# Altium footprint library con-molex.PCBLIB: 369 footprints (part 16 of 26)
Each footprint in its own frame and in the unit in brackets; x right, y up, seen from the top. Pads: shape width x height; smd on the part's side, far side on the other; paste and mask are expansions set on the pad; w line width, h text height; cw(c..) or ccw(c..) is an arc to the next point about the centre after c.
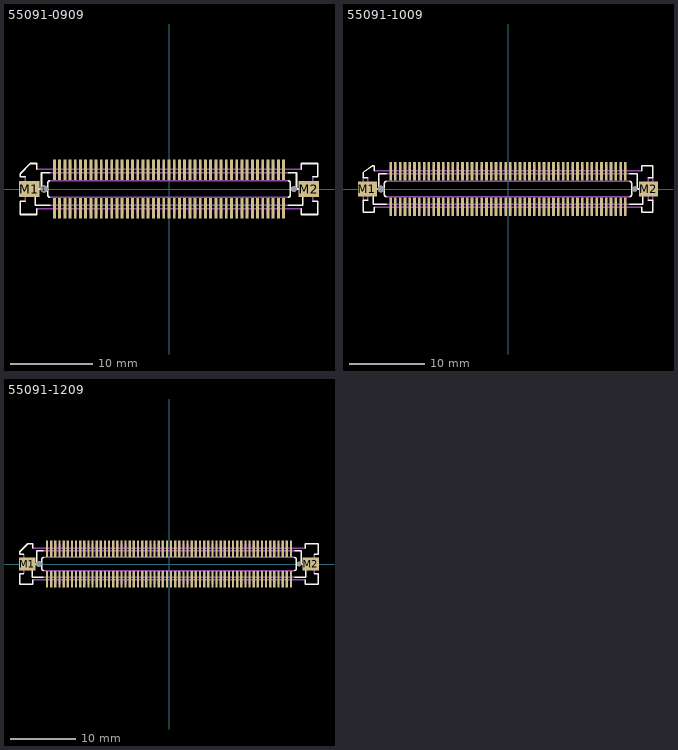
[diagram p15: the footprints below, top view; thin cyan lines are the x and y axes]

## 55091-0909 [mm]
pads (94):
  round 0.9 hole 0.9: 1(-15.225,0)
  rect 0.35x2.5 smd: 1(-13.97,2.35) 2(-13.97,-2.35) 3(-13.335,2.35) 4(-13.335,-2.35) 5(-12.7,2.35) 6(-12.7,-2.35) 7(-12.065,2.35) 8(-12.065,-2.35) 9(-11.43,2.35) 10(-11.43,-2.35) 11(-10.795,2.35) 12(-10.795,-2.35) 13(-10.16,2.35) 14(-10.16,-2.35) 15(-9.525,2.35) 16(-9.525,-2.35) 17(-8.89,2.35) 18(-8.89,-2.35) 19(-8.255,2.35) 20(-8.255,-2.35) 21(-7.62,2.35) 22(-7.62,-2.35) 23(-6.985,2.35) 24(-6.985,-2.35) 25(-6.35,2.35) 26(-6.35,-2.35) 27(-5.715,2.35) 28(-5.715,-2.35) 29(-5.08,2.35) 30(-5.08,-2.35) 31(-4.445,2.35) 32(-4.445,-2.35) 33(-3.81,2.35) 34(-3.81,-2.35) 35(-3.175,2.35) 36(-3.175,-2.35) 37(-2.54,2.35) 38(-2.54,-2.35) 39(-1.905,2.35) 40(-1.905,-2.35) 41(-1.27,2.35) 42(-1.27,-2.35) 43(-0.635,2.35) 44(-0.635,-2.35) 45(0,2.35) 46(0,-2.35) 47(0.635,2.35) 48(0.635,-2.35) 49(1.27,2.35) 50(1.27,-2.35) 51(1.905,2.35) 52(1.905,-2.35) 53(2.54,2.35) 54(2.54,-2.35) 55(3.175,2.35) 56(3.175,-2.35) 57(3.81,2.35) 58(3.81,-2.35) 59(4.445,2.35) 60(4.445,-2.35) 61(5.08,2.35) 62(5.08,-2.35) 63(5.715,2.35) 64(5.715,-2.35) 65(6.35,2.35) 66(6.35,-2.35) 67(6.985,2.35) 68(6.985,-2.35) 69(7.62,2.35) 70(7.62,-2.35) 71(8.255,2.35) 72(8.255,-2.35) 73(8.89,2.35) 74(8.89,-2.35) 75(9.525,2.35) 76(9.525,-2.35) 77(10.16,2.35) 78(10.16,-2.35) 79(10.795,2.35) 80(10.795,-2.35) 81(11.43,2.35) 82(11.43,-2.35) 83(12.065,2.35) 84(12.065,-2.35) 85(12.7,2.35) 86(12.7,-2.35) 87(13.335,2.35) 88(13.335,-2.35) 89(13.97,2.35) 90(13.97,-2.35)
  round 0.7 hole 0.7: 1(15.225,0)
  rect 2.5x2 smd: M1(-17.038,0) M2(17.038,0)
Top Overlay:
  lines w0.203: -17.537,-1.5 -18.137,-1.5 -18.137,-3.1 -16.137,-3.1 -16.137,-2.4 ; -17.537,1.5 -18.137,1.5 -18.137,1.875 -16.913,3.1 -16.137,3.1 -16.137,2.4 ; -14.537,-2 -16.287,-2 -16.287,0 -15.537,0 -15.537,2 -14.537,2 ; -14.537,-1 cw(c-14.538,-0.75) -14.788,-0.75 -14.788,0.75 cw(c-14.538,0.75) -14.537,1 ; 14.537,-2 16.287,-2 16.287,0 15.537,0 15.537,2 14.537,2 ; 14.537,-1 ccw(c14.538,-0.75) 14.788,-0.75 14.788,0.75 ccw(c14.538,0.75) 14.537,1 ; 16.137,-2.4 16.137,-3.1 18.137,-3.1 18.137,-1.5 17.537,-1.5 ; 16.137,2.4 16.137,3.1 18.137,3.1 18.137,1.5 17.537,1.5
Top Solder:
  rectangle: -14.17,1.075 -13.77,3.625
  region: -13.77,-1.075 -14.17,-1.075 -14.17,-3.625 -13.77,-3.625
  rectangle: -13.535,1.075 -13.135,3.625
  region: -13.135,-1.075 -13.535,-1.075 -13.535,-3.625 -13.135,-3.625
  rectangle: -12.9,1.075 -12.5,3.625
  region: -12.5,-1.075 -12.9,-1.075 -12.9,-3.625 -12.5,-3.625
  rectangle: -12.265,1.075 -11.865,3.625
  region: -11.865,-1.075 -12.265,-1.075 -12.265,-3.625 -11.865,-3.625
  rectangle: -11.63,1.075 -11.23,3.625
  region: -11.23,-1.075 -11.63,-1.075 -11.63,-3.625 -11.23,-3.625
  rectangle: -10.995,1.075 -10.595,3.625
  region: -10.595,-1.075 -10.995,-1.075 -10.995,-3.625 -10.595,-3.625
  rectangle: -10.36,1.075 -9.96,3.625
  region: -9.96,-1.075 -10.36,-1.075 -10.36,-3.625 -9.96,-3.625
  rectangle: -9.725,1.075 -9.325,3.625
  region: -9.325,-1.075 -9.725,-1.075 -9.725,-3.625 -9.325,-3.625
  rectangle: -9.09,1.075 -8.69,3.625
  region: -8.69,-1.075 -9.09,-1.075 -9.09,-3.625 -8.69,-3.625
  rectangle: -8.455,1.075 -8.055,3.625
  region: -8.055,-1.075 -8.455,-1.075 -8.455,-3.625 -8.055,-3.625
  rectangle: -7.82,1.075 -7.42,3.625
  region: -7.42,-1.075 -7.82,-1.075 -7.82,-3.625 -7.42,-3.625
  rectangle: -7.185,1.075 -6.785,3.625
  region: -6.785,-1.075 -7.185,-1.075 -7.185,-3.625 -6.785,-3.625
  rectangle: -6.55,1.075 -6.15,3.625
  region: -6.15,-1.075 -6.55,-1.075 -6.55,-3.625 -6.15,-3.625
  rectangle: -5.915,1.075 -5.515,3.625
  region: -5.515,-1.075 -5.915,-1.075 -5.915,-3.625 -5.515,-3.625
  rectangle: -5.28,1.075 -4.88,3.625
  region: -4.88,-1.075 -5.28,-1.075 -5.28,-3.625 -4.88,-3.625
  rectangle: -4.645,1.075 -4.245,3.625
  region: -4.245,-1.075 -4.645,-1.075 -4.645,-3.625 -4.245,-3.625
  rectangle: -4.01,1.075 -3.61,3.625
  region: -3.61,-1.075 -4.01,-1.075 -4.01,-3.625 -3.61,-3.625
  rectangle: -3.375,1.075 -2.975,3.625
  region: -2.975,-1.075 -3.375,-1.075 -3.375,-3.625 -2.975,-3.625
  rectangle: -2.74,1.075 -2.34,3.625
  region: -2.34,-1.075 -2.74,-1.075 -2.74,-3.625 -2.34,-3.625
  rectangle: -2.105,1.075 -1.705,3.625
  region: -1.705,-1.075 -2.105,-1.075 -2.105,-3.625 -1.705,-3.625
  rectangle: -1.47,1.075 -1.07,3.625
  region: -1.07,-1.075 -1.47,-1.075 -1.47,-3.625 -1.07,-3.625
  rectangle: -0.835,1.075 -0.435,3.625
  region: -0.435,-1.075 -0.835,-1.075 -0.835,-3.625 -0.435,-3.625
  rectangle: -0.2,1.075 0.2,3.625
  region: 0.2,-1.075 -0.2,-1.075 -0.2,-3.625 0.2,-3.625
  rectangle: 0.435,1.075 0.835,3.625
  region: 0.835,-1.075 0.435,-1.075 0.435,-3.625 0.835,-3.625
  rectangle: 1.07,1.075 1.47,3.625
  region: 1.47,-1.075 1.07,-1.075 1.07,-3.625 1.47,-3.625
  rectangle: 1.705,1.075 2.105,3.625
  region: 2.105,-1.075 1.705,-1.075 1.705,-3.625 2.105,-3.625
  rectangle: 2.34,1.075 2.74,3.625
  region: 2.74,-1.075 2.34,-1.075 2.34,-3.625 2.74,-3.625
  rectangle: 2.975,1.075 3.375,3.625
  region: 3.375,-1.075 2.975,-1.075 2.975,-3.625 3.375,-3.625
  rectangle: 3.61,1.075 4.01,3.625
  region: 4.01,-1.075 3.61,-1.075 3.61,-3.625 4.01,-3.625
  rectangle: 4.245,1.075 4.645,3.625
  region: 4.645,-1.075 4.245,-1.075 4.245,-3.625 4.645,-3.625
  rectangle: 4.88,1.075 5.28,3.625
  region: 5.28,-1.075 4.88,-1.075 4.88,-3.625 5.28,-3.625
  rectangle: 5.515,1.075 5.915,3.625
  region: 5.915,-1.075 5.515,-1.075 5.515,-3.625 5.915,-3.625
  rectangle: 6.15,1.075 6.55,3.625
  region: 6.55,-1.075 6.15,-1.075 6.15,-3.625 6.55,-3.625
  rectangle: 6.785,1.075 7.185,3.625
  region: 7.185,-1.075 6.785,-1.075 6.785,-3.625 7.185,-3.625
  rectangle: 7.42,1.075 7.82,3.625
  region: 7.82,-1.075 7.42,-1.075 7.42,-3.625 7.82,-3.625
  rectangle: 8.055,1.075 8.455,3.625
  region: 8.455,-1.075 8.055,-1.075 8.055,-3.625 8.455,-3.625
  rectangle: 8.69,1.075 9.09,3.625
  region: 9.09,-1.075 8.69,-1.075 8.69,-3.625 9.09,-3.625
  rectangle: 9.325,1.075 9.725,3.625
  region: 9.725,-1.075 9.325,-1.075 9.325,-3.625 9.725,-3.625
  rectangle: 9.96,1.075 10.36,3.625
  region: 10.36,-1.075 9.96,-1.075 9.96,-3.625 10.36,-3.625
  rectangle: 10.595,1.075 10.995,3.625
  region: 10.995,-1.075 10.595,-1.075 10.595,-3.625 10.995,-3.625
  rectangle: 11.23,1.075 11.63,3.625
  region: 11.63,-1.075 11.23,-1.075 11.23,-3.625 11.63,-3.625
  rectangle: 11.865,1.075 12.265,3.625
  region: 12.265,-1.075 11.865,-1.075 11.865,-3.625 12.265,-3.625
  rectangle: 12.5,1.075 12.9,3.625
  region: 12.9,-1.075 12.5,-1.075 12.5,-3.625 12.9,-3.625
  rectangle: 13.135,1.075 13.535,3.625
  region: 13.535,-1.075 13.135,-1.075 13.135,-3.625 13.535,-3.625
  rectangle: 13.77,1.075 14.17,3.625
  region: 14.17,-1.075 13.77,-1.075 13.77,-3.625 14.17,-3.625
Mechanical 16:
  rectangle: -14.12,-3.1 -13.82,-2.375
  region: -13.82,3.1 -14.12,3.1 -14.12,2.375 -13.82,2.375
  rectangle: -13.485,-3.1 -13.185,-2.375
  region: -13.185,3.1 -13.485,3.1 -13.485,2.375 -13.185,2.375
  rectangle: -12.85,-3.1 -12.55,-2.375
  region: -12.55,3.1 -12.85,3.1 -12.85,2.375 -12.55,2.375
  rectangle: -12.215,-3.1 -11.915,-2.375
  region: -11.915,3.1 -12.215,3.1 -12.215,2.375 -11.915,2.375
  rectangle: -11.58,-3.1 -11.28,-2.375
  region: -11.28,3.1 -11.58,3.1 -11.58,2.375 -11.28,2.375
  rectangle: -10.945,-3.1 -10.645,-2.375
  region: -10.645,3.1 -10.945,3.1 -10.945,2.375 -10.645,2.375
  rectangle: -10.31,-3.1 -10.01,-2.375
  region: -10.01,3.1 -10.31,3.1 -10.31,2.375 -10.01,2.375
  rectangle: -9.675,-3.1 -9.375,-2.375
  region: -9.375,3.1 -9.675,3.1 -9.675,2.375 -9.375,2.375
  rectangle: -9.04,-3.1 -8.74,-2.375
  region: -8.74,3.1 -9.04,3.1 -9.04,2.375 -8.74,2.375
  rectangle: -8.405,-3.1 -8.105,-2.375
  region: -8.105,3.1 -8.405,3.1 -8.405,2.375 -8.105,2.375
  rectangle: -7.77,-3.1 -7.47,-2.375
  region: -7.47,3.1 -7.77,3.1 -7.77,2.375 -7.47,2.375
  rectangle: -7.135,-3.1 -6.835,-2.375
  region: -6.835,3.1 -7.135,3.1 -7.135,2.375 -6.835,2.375
  rectangle: -6.5,-3.1 -6.2,-2.375
  region: -6.2,3.1 -6.5,3.1 -6.5,2.375 -6.2,2.375
  rectangle: -5.865,-3.1 -5.565,-2.375
  region: -5.565,3.1 -5.865,3.1 -5.865,2.375 -5.565,2.375
  rectangle: -5.23,-3.1 -4.93,-2.375
  region: -4.93,3.1 -5.23,3.1 -5.23,2.375 -4.93,2.375
  rectangle: -4.595,-3.1 -4.295,-2.375
  region: -4.295,3.1 -4.595,3.1 -4.595,2.375 -4.295,2.375
  rectangle: -3.96,-3.1 -3.66,-2.375
  region: -3.66,3.1 -3.96,3.1 -3.96,2.375 -3.66,2.375
  rectangle: -3.325,-3.1 -3.025,-2.375
  region: -3.025,3.1 -3.325,3.1 -3.325,2.375 -3.025,2.375
  rectangle: -2.69,-3.1 -2.39,-2.375
  region: -2.39,3.1 -2.69,3.1 -2.69,2.375 -2.39,2.375
  rectangle: -2.055,-3.1 -1.755,-2.375
  region: -1.755,3.1 -2.055,3.1 -2.055,2.375 -1.755,2.375
  rectangle: -1.42,-3.1 -1.12,-2.375
  region: -1.12,3.1 -1.42,3.1 -1.42,2.375 -1.12,2.375
  rectangle: -0.785,-3.1 -0.485,-2.375
  region: -0.485,3.1 -0.785,3.1 -0.785,2.375 -0.485,2.375
  rectangle: -0.15,-3.1 0.15,-2.375
  region: 0.15,3.1 -0.15,3.1 -0.15,2.375 0.15,2.375
  rectangle: 0.485,-3.1 0.785,-2.375
  region: 0.785,3.1 0.485,3.1 0.485,2.375 0.785,2.375
  rectangle: 1.12,-3.1 1.42,-2.375
  region: 1.42,3.1 1.12,3.1 1.12,2.375 1.42,2.375
  rectangle: 1.755,-3.1 2.055,-2.375
  region: 2.055,3.1 1.755,3.1 1.755,2.375 2.055,2.375
  rectangle: 2.39,-3.1 2.69,-2.375
  region: 2.69,3.1 2.39,3.1 2.39,2.375 2.69,2.375
  rectangle: 3.025,-3.1 3.325,-2.375
  region: 3.325,3.1 3.025,3.1 3.025,2.375 3.325,2.375
  rectangle: 3.66,-3.1 3.96,-2.375
  region: 3.96,3.1 3.66,3.1 3.66,2.375 3.96,2.375
  rectangle: 4.295,-3.1 4.595,-2.375
  region: 4.595,3.1 4.295,3.1 4.295,2.375 4.595,2.375
  rectangle: 4.93,-3.1 5.23,-2.375
  region: 5.23,3.1 4.93,3.1 4.93,2.375 5.23,2.375
  rectangle: 5.565,-3.1 5.865,-2.375
  region: 5.865,3.1 5.565,3.1 5.565,2.375 5.865,2.375
  rectangle: 6.2,-3.1 6.5,-2.375
  region: 6.5,3.1 6.2,3.1 6.2,2.375 6.5,2.375
  rectangle: 6.835,-3.1 7.135,-2.375
  region: 7.135,3.1 6.835,3.1 6.835,2.375 7.135,2.375
  rectangle: 7.47,-3.1 7.77,-2.375
  region: 7.77,3.1 7.47,3.1 7.47,2.375 7.77,2.375
  rectangle: 8.105,-3.1 8.405,-2.375
  region: 8.405,3.1 8.105,3.1 8.105,2.375 8.405,2.375
  rectangle: 8.74,-3.1 9.04,-2.375
  region: 9.04,3.1 8.74,3.1 8.74,2.375 9.04,2.375
  rectangle: 9.375,-3.1 9.675,-2.375
  region: 9.675,3.1 9.375,3.1 9.375,2.375 9.675,2.375
  rectangle: 10.01,-3.1 10.31,-2.375
  region: 10.31,3.1 10.01,3.1 10.01,2.375 10.31,2.375
  rectangle: 10.645,-3.1 10.945,-2.375
  region: 10.945,3.1 10.645,3.1 10.645,2.375 10.945,2.375
  rectangle: 11.28,-3.1 11.58,-2.375
  region: 11.58,3.1 11.28,3.1 11.28,2.375 11.58,2.375
  rectangle: 11.915,-3.1 12.215,-2.375
  region: 12.215,3.1 11.915,3.1 11.915,2.375 12.215,2.375
  rectangle: 12.55,-3.1 12.85,-2.375
  region: 12.85,3.1 12.55,3.1 12.55,2.375 12.85,2.375
  rectangle: 13.185,-3.1 13.485,-2.375
  region: 13.485,3.1 13.185,3.1 13.185,2.375 13.485,2.375
  rectangle: 13.82,-3.1 14.12,-2.375
  region: 14.12,3.1 13.82,3.1 13.82,2.375 14.12,2.375
  lines w0.203: -17.537,-1.5 -17.537,1.5 ; -16.137,-2.4 16.137,-2.4 ; -16.137,2.4 16.137,2.4 ; -14.537,-2 14.537,-2 ; -14.537,-1 14.537,-1 ; -14.537,1 14.537,1 ; -14.537,2 14.537,2 ; 17.537,-1.5 17.537,1.5

## 55091-1009 [mm]
pads (104):
  round 0.9 hole 0.9: 1(-16.81,0)
  rect 0.35x2.5 smd: 1(-15.557,2.35) 2(-15.557,-2.35) 3(-14.922,2.35) 4(-14.922,-2.35) 5(-14.287,2.35) 6(-14.287,-2.35) 7(-13.652,2.35) 8(-13.652,-2.35) 9(-13.018,2.35) 10(-13.018,-2.35) 11(-12.383,2.35) 12(-12.383,-2.35) 13(-11.747,2.35) 14(-11.747,-2.35) 15(-11.112,2.35) 16(-11.112,-2.35) 17(-10.477,2.35) 18(-10.477,-2.35) 19(-9.842,2.35) 20(-9.842,-2.35) 21(-9.207,2.35) 22(-9.207,-2.35) 23(-8.572,2.35) 24(-8.572,-2.35) 25(-7.938,2.35) 26(-7.938,-2.35) 27(-7.302,2.35) 28(-7.302,-2.35) 29(-6.667,2.35) 30(-6.667,-2.35) 31(-6.032,2.35) 32(-6.032,-2.35) 33(-5.397,2.35) 34(-5.397,-2.35) 35(-4.763,2.35) 36(-4.763,-2.35) 37(-4.127,2.35) 38(-4.127,-2.35) 39(-3.492,2.35) 40(-3.492,-2.35) 41(-2.857,2.35) 42(-2.857,-2.35) 43(-2.222,2.35) 44(-2.222,-2.35) 45(-1.587,2.35) 46(-1.587,-2.35) 47(-0.953,2.35) 48(-0.953,-2.35) 49(-0.318,2.35) 50(-0.318,-2.35) 51(0.318,2.35) 52(0.318,-2.35) 53(0.953,2.35) 54(0.953,-2.35) 55(1.587,2.35) 56(1.587,-2.35) 57(2.222,2.35) 58(2.222,-2.35) 59(2.857,2.35) 60(2.857,-2.35) 61(3.492,2.35) 62(3.492,-2.35) 63(4.127,2.35) 64(4.127,-2.35) 65(4.763,2.35) 66(4.763,-2.35) 67(5.397,2.35) 68(5.397,-2.35) 69(6.032,2.35) 70(6.032,-2.35) 71(6.667,2.35) 72(6.667,-2.35) 73(7.302,2.35) 74(7.302,-2.35) 75(7.938,2.35) 76(7.938,-2.35) 77(8.572,2.35) 78(8.572,-2.35) 79(9.207,2.35) 80(9.207,-2.35) 81(9.842,2.35) 82(9.842,-2.35) 83(10.477,2.35) 84(10.477,-2.35) 85(11.112,2.35) 86(11.112,-2.35) 87(11.747,2.35) 88(11.747,-2.35) 89(12.383,2.35) 90(12.383,-2.35) 91(13.018,2.35) 92(13.018,-2.35) 93(13.652,2.35) 94(13.652,-2.35) 95(14.287,2.35) 96(14.287,-2.35) 97(14.922,2.35) 98(14.922,-2.35) 99(15.557,2.35) 100(15.557,-2.35)
  round 0.7 hole 0.7: 1(16.81,0)
  rect 2.5x2 smd: M1(-18.625,0) M2(18.625,0)
Top Overlay:
  lines w0.203: -18.6,-1.5 -19.2,-1.5 -19.2,-3.1 -17.725,-3.1 -17.725,-2.4 ; -18.6,1.5 -19.2,1.5 -19.2,2.175 -17.975,3.1 -17.725,3.1 -17.725,2.4 ; -16.125,-2 -17.875,-2 -17.875,0 -17.125,0 -17.125,2 -16.125,2 ; -16.125,-1 cw(c-16.125,-0.75) -16.375,-0.75 -16.375,0.75 cw(c-16.125,0.75) -16.125,1 ; 16.125,-2 17.875,-2 17.875,0 17.125,0 17.125,2 16.125,2 ; 16.125,-1 ccw(c16.125,-0.75) 16.375,-0.75 16.375,0.75 ccw(c16.125,0.75) 16.125,1 ; 17.725,-2.4 17.725,-3.1 19.2,-3.1 19.2,-1.5 18.6,-1.5 ; 17.725,2.4 17.725,3.1 19.2,3.1 19.2,1.5 18.6,1.5
Top Solder:
  rectangle: -15.757,1.075 -15.358,3.625
  region: -15.358,-1.075 -15.757,-1.075 -15.757,-3.625 -15.358,-3.625
  rectangle: -15.122,1.075 -14.723,3.625
  region: -14.723,-1.075 -15.122,-1.075 -15.122,-3.625 -14.723,-3.625
  rectangle: -14.487,1.075 -14.088,3.625
  region: -14.088,-1.075 -14.487,-1.075 -14.487,-3.625 -14.088,-3.625
  rectangle: -13.852,1.075 -13.453,3.625
  region: -13.453,-1.075 -13.852,-1.075 -13.852,-3.625 -13.453,-3.625
  rectangle: -13.217,1.075 -12.818,3.625
  region: -12.818,-1.075 -13.217,-1.075 -13.217,-3.625 -12.818,-3.625
  rectangle: -12.582,1.075 -12.183,3.625
  region: -12.183,-1.075 -12.582,-1.075 -12.582,-3.625 -12.183,-3.625
  rectangle: -11.947,1.075 -11.548,3.625
  region: -11.548,-1.075 -11.947,-1.075 -11.947,-3.625 -11.548,-3.625
  rectangle: -11.312,1.075 -10.913,3.625
  region: -10.913,-1.075 -11.312,-1.075 -11.312,-3.625 -10.913,-3.625
  rectangle: -10.677,1.075 -10.278,3.625
  region: -10.278,-1.075 -10.677,-1.075 -10.677,-3.625 -10.278,-3.625
  rectangle: -10.042,1.075 -9.643,3.625
  region: -9.643,-1.075 -10.042,-1.075 -10.042,-3.625 -9.643,-3.625
  rectangle: -9.407,1.075 -9.008,3.625
  region: -9.008,-1.075 -9.407,-1.075 -9.407,-3.625 -9.008,-3.625
  rectangle: -8.772,1.075 -8.373,3.625
  region: -8.373,-1.075 -8.772,-1.075 -8.772,-3.625 -8.373,-3.625
  rectangle: -8.137,1.075 -7.738,3.625
  region: -7.738,-1.075 -8.137,-1.075 -8.137,-3.625 -7.738,-3.625
  rectangle: -7.502,1.075 -7.103,3.625
  region: -7.103,-1.075 -7.502,-1.075 -7.502,-3.625 -7.103,-3.625
  rectangle: -6.867,1.075 -6.468,3.625
  region: -6.468,-1.075 -6.867,-1.075 -6.867,-3.625 -6.468,-3.625
  rectangle: -6.232,1.075 -5.833,3.625
  region: -5.833,-1.075 -6.232,-1.075 -6.232,-3.625 -5.833,-3.625
  rectangle: -5.597,1.075 -5.198,3.625
  region: -5.198,-1.075 -5.597,-1.075 -5.597,-3.625 -5.198,-3.625
  rectangle: -4.962,1.075 -4.563,3.625
  region: -4.563,-1.075 -4.962,-1.075 -4.962,-3.625 -4.563,-3.625
  rectangle: -4.327,1.075 -3.928,3.625
  region: -3.928,-1.075 -4.327,-1.075 -4.327,-3.625 -3.928,-3.625
  rectangle: -3.692,1.075 -3.293,3.625
  region: -3.293,-1.075 -3.692,-1.075 -3.692,-3.625 -3.293,-3.625
  rectangle: -3.057,1.075 -2.658,3.625
  region: -2.658,-1.075 -3.057,-1.075 -3.057,-3.625 -2.658,-3.625
  rectangle: -2.422,1.075 -2.023,3.625
  region: -2.023,-1.075 -2.422,-1.075 -2.422,-3.625 -2.023,-3.625
  rectangle: -1.787,1.075 -1.388,3.625
  region: -1.388,-1.075 -1.787,-1.075 -1.787,-3.625 -1.388,-3.625
  rectangle: -1.152,1.075 -0.753,3.625
  region: -0.753,-1.075 -1.152,-1.075 -1.152,-3.625 -0.753,-3.625
  rectangle: -0.517,1.075 -0.118,3.625
  region: -0.118,-1.075 -0.517,-1.075 -0.517,-3.625 -0.118,-3.625
  rectangle: 0.118,1.075 0.517,3.625
  region: 0.517,-1.075 0.118,-1.075 0.118,-3.625 0.517,-3.625
  rectangle: 0.753,1.075 1.152,3.625
  region: 1.152,-1.075 0.753,-1.075 0.753,-3.625 1.152,-3.625
  rectangle: 1.388,1.075 1.787,3.625
  region: 1.787,-1.075 1.388,-1.075 1.388,-3.625 1.787,-3.625
  rectangle: 2.023,1.075 2.422,3.625
  region: 2.422,-1.075 2.023,-1.075 2.023,-3.625 2.422,-3.625
  rectangle: 2.658,1.075 3.057,3.625
  region: 3.057,-1.075 2.658,-1.075 2.658,-3.625 3.057,-3.625
  rectangle: 3.293,1.075 3.692,3.625
  region: 3.692,-1.075 3.293,-1.075 3.293,-3.625 3.692,-3.625
  rectangle: 3.928,1.075 4.327,3.625
  region: 4.327,-1.075 3.928,-1.075 3.928,-3.625 4.327,-3.625
  rectangle: 4.563,1.075 4.962,3.625
  region: 4.962,-1.075 4.563,-1.075 4.563,-3.625 4.962,-3.625
  rectangle: 5.198,1.075 5.597,3.625
  region: 5.597,-1.075 5.198,-1.075 5.198,-3.625 5.597,-3.625
  rectangle: 5.833,1.075 6.232,3.625
  region: 6.232,-1.075 5.833,-1.075 5.833,-3.625 6.232,-3.625
  rectangle: 6.468,1.075 6.867,3.625
  region: 6.867,-1.075 6.468,-1.075 6.468,-3.625 6.867,-3.625
  rectangle: 7.103,1.075 7.502,3.625
  region: 7.502,-1.075 7.103,-1.075 7.103,-3.625 7.502,-3.625
  rectangle: 7.738,1.075 8.137,3.625
  region: 8.137,-1.075 7.738,-1.075 7.738,-3.625 8.137,-3.625
  rectangle: 8.373,1.075 8.772,3.625
  region: 8.772,-1.075 8.373,-1.075 8.373,-3.625 8.772,-3.625
  rectangle: 9.008,1.075 9.407,3.625
  region: 9.407,-1.075 9.008,-1.075 9.008,-3.625 9.407,-3.625
  rectangle: 9.643,1.075 10.042,3.625
  region: 10.042,-1.075 9.643,-1.075 9.643,-3.625 10.042,-3.625
  rectangle: 10.278,1.075 10.677,3.625
  region: 10.677,-1.075 10.278,-1.075 10.278,-3.625 10.677,-3.625
  rectangle: 10.913,1.075 11.312,3.625
  region: 11.312,-1.075 10.913,-1.075 10.913,-3.625 11.312,-3.625
  rectangle: 11.548,1.075 11.947,3.625
  region: 11.947,-1.075 11.548,-1.075 11.548,-3.625 11.947,-3.625
  rectangle: 12.183,1.075 12.582,3.625
  region: 12.582,-1.075 12.183,-1.075 12.183,-3.625 12.582,-3.625
  rectangle: 12.818,1.075 13.217,3.625
  region: 13.217,-1.075 12.818,-1.075 12.818,-3.625 13.217,-3.625
  rectangle: 13.453,1.075 13.852,3.625
  region: 13.852,-1.075 13.453,-1.075 13.453,-3.625 13.852,-3.625
  rectangle: 14.088,1.075 14.487,3.625
  region: 14.487,-1.075 14.088,-1.075 14.088,-3.625 14.487,-3.625
  rectangle: 14.723,1.075 15.122,3.625
  region: 15.122,-1.075 14.723,-1.075 14.723,-3.625 15.122,-3.625
  rectangle: 15.358,1.075 15.757,3.625
  region: 15.757,-1.075 15.358,-1.075 15.358,-3.625 15.757,-3.625
Mechanical 16:
  rectangle: -15.708,-3.1 -15.407,-2.375
  region: -15.407,3.1 -15.708,3.1 -15.708,2.375 -15.407,2.375
  rectangle: -15.073,-3.1 -14.772,-2.375
  region: -14.772,3.1 -15.073,3.1 -15.073,2.375 -14.772,2.375
  rectangle: -14.438,-3.1 -14.137,-2.375
  region: -14.137,3.1 -14.438,3.1 -14.438,2.375 -14.137,2.375
  rectangle: -13.803,-3.1 -13.502,-2.375
  region: -13.502,3.1 -13.803,3.1 -13.803,2.375 -13.502,2.375
  rectangle: -13.168,-3.1 -12.867,-2.375
  region: -12.867,3.1 -13.168,3.1 -13.168,2.375 -12.867,2.375
  rectangle: -12.533,-3.1 -12.232,-2.375
  region: -12.232,3.1 -12.533,3.1 -12.533,2.375 -12.232,2.375
  rectangle: -11.898,-3.1 -11.597,-2.375
  region: -11.597,3.1 -11.898,3.1 -11.898,2.375 -11.597,2.375
  rectangle: -11.263,-3.1 -10.962,-2.375
  region: -10.962,3.1 -11.263,3.1 -11.263,2.375 -10.962,2.375
  rectangle: -10.628,-3.1 -10.327,-2.375
  region: -10.327,3.1 -10.628,3.1 -10.628,2.375 -10.327,2.375
  rectangle: -9.993,-3.1 -9.692,-2.375
  region: -9.692,3.1 -9.993,3.1 -9.993,2.375 -9.692,2.375
  rectangle: -9.358,-3.1 -9.057,-2.375
  region: -9.057,3.1 -9.358,3.1 -9.358,2.375 -9.057,2.375
  rectangle: -8.723,-3.1 -8.422,-2.375
  region: -8.422,3.1 -8.723,3.1 -8.723,2.375 -8.422,2.375
  rectangle: -8.088,-3.1 -7.787,-2.375
  region: -7.787,3.1 -8.088,3.1 -8.088,2.375 -7.787,2.375
  rectangle: -7.453,-3.1 -7.152,-2.375
  region: -7.152,3.1 -7.453,3.1 -7.453,2.375 -7.152,2.375
  rectangle: -6.818,-3.1 -6.517,-2.375
  region: -6.517,3.1 -6.818,3.1 -6.818,2.375 -6.517,2.375
  rectangle: -6.183,-3.1 -5.882,-2.375
  region: -5.882,3.1 -6.183,3.1 -6.183,2.375 -5.882,2.375
  rectangle: -5.548,-3.1 -5.247,-2.375
  region: -5.247,3.1 -5.548,3.1 -5.548,2.375 -5.247,2.375
  rectangle: -4.913,-3.1 -4.612,-2.375
  region: -4.612,3.1 -4.913,3.1 -4.913,2.375 -4.612,2.375
  rectangle: -4.278,-3.1 -3.977,-2.375
  region: -3.977,3.1 -4.278,3.1 -4.278,2.375 -3.977,2.375
  rectangle: -3.643,-3.1 -3.342,-2.375
  region: -3.342,3.1 -3.643,3.1 -3.643,2.375 -3.342,2.375
  rectangle: -3.008,-3.1 -2.707,-2.375
  region: -2.707,3.1 -3.008,3.1 -3.008,2.375 -2.707,2.375
  rectangle: -2.373,-3.1 -2.072,-2.375
  region: -2.072,3.1 -2.373,3.1 -2.373,2.375 -2.072,2.375
  rectangle: -1.738,-3.1 -1.437,-2.375
  region: -1.437,3.1 -1.738,3.1 -1.738,2.375 -1.437,2.375
  rectangle: -1.103,-3.1 -0.802,-2.375
  region: -0.802,3.1 -1.103,3.1 -1.103,2.375 -0.802,2.375
  rectangle: -0.468,-3.1 -0.167,-2.375
  region: -0.167,3.1 -0.468,3.1 -0.468,2.375 -0.167,2.375
  rectangle: 0.167,-3.1 0.468,-2.375
  region: 0.468,3.1 0.167,3.1 0.167,2.375 0.468,2.375
  rectangle: 0.802,-3.1 1.103,-2.375
  region: 1.103,3.1 0.802,3.1 0.802,2.375 1.103,2.375
  rectangle: 1.437,-3.1 1.738,-2.375
  region: 1.738,3.1 1.437,3.1 1.437,2.375 1.738,2.375
  rectangle: 2.072,-3.1 2.373,-2.375
  region: 2.373,3.1 2.072,3.1 2.072,2.375 2.373,2.375
  rectangle: 2.707,-3.1 3.008,-2.375
  region: 3.008,3.1 2.707,3.1 2.707,2.375 3.008,2.375
  rectangle: 3.342,-3.1 3.643,-2.375
  region: 3.643,3.1 3.342,3.1 3.342,2.375 3.643,2.375
  rectangle: 3.977,-3.1 4.278,-2.375
  region: 4.278,3.1 3.977,3.1 3.977,2.375 4.278,2.375
  rectangle: 4.612,-3.1 4.913,-2.375
  region: 4.913,3.1 4.612,3.1 4.612,2.375 4.913,2.375
  rectangle: 5.247,-3.1 5.548,-2.375
  region: 5.548,3.1 5.247,3.1 5.247,2.375 5.548,2.375
  rectangle: 5.882,-3.1 6.183,-2.375
  region: 6.183,3.1 5.882,3.1 5.882,2.375 6.183,2.375
  rectangle: 6.517,-3.1 6.818,-2.375
  region: 6.818,3.1 6.517,3.1 6.517,2.375 6.818,2.375
  rectangle: 7.152,-3.1 7.453,-2.375
  region: 7.453,3.1 7.152,3.1 7.152,2.375 7.453,2.375
  rectangle: 7.787,-3.1 8.088,-2.375
  region: 8.088,3.1 7.787,3.1 7.787,2.375 8.088,2.375
  rectangle: 8.422,-3.1 8.723,-2.375
  region: 8.723,3.1 8.422,3.1 8.422,2.375 8.723,2.375
  rectangle: 9.057,-3.1 9.358,-2.375
  region: 9.358,3.1 9.057,3.1 9.057,2.375 9.358,2.375
  rectangle: 9.692,-3.1 9.993,-2.375
  region: 9.993,3.1 9.692,3.1 9.692,2.375 9.993,2.375
  rectangle: 10.327,-3.1 10.628,-2.375
  region: 10.628,3.1 10.327,3.1 10.327,2.375 10.628,2.375
  rectangle: 10.962,-3.1 11.263,-2.375
  region: 11.263,3.1 10.962,3.1 10.962,2.375 11.263,2.375
  rectangle: 11.597,-3.1 11.898,-2.375
  region: 11.898,3.1 11.597,3.1 11.597,2.375 11.898,2.375
  rectangle: 12.232,-3.1 12.533,-2.375
  region: 12.533,3.1 12.232,3.1 12.232,2.375 12.533,2.375
  rectangle: 12.867,-3.1 13.168,-2.375
  region: 13.168,3.1 12.867,3.1 12.867,2.375 13.168,2.375
  rectangle: 13.502,-3.1 13.803,-2.375
  region: 13.803,3.1 13.502,3.1 13.502,2.375 13.803,2.375
  rectangle: 14.137,-3.1 14.438,-2.375
  region: 14.438,3.1 14.137,3.1 14.137,2.375 14.438,2.375
  rectangle: 14.772,-3.1 15.073,-2.375
  region: 15.073,3.1 14.772,3.1 14.772,2.375 15.073,2.375
  rectangle: 15.407,-3.1 15.708,-2.375
  region: 15.708,3.1 15.407,3.1 15.407,2.375 15.708,2.375
  lines w0.203: -19.2,-1.525 -19.2,1.5 ; -18.6,-1.5 -18.6,1.5 ; -17.725,-2.4 17.725,-2.4 ; -17.725,2.4 17.725,2.4 ; -16.125,-2 16.125,-2 ; -16.125,-1 16.125,-1 ; -16.125,1 16.125,1 ; -16.125,2 16.125,2 ; 18.6,-1.5 18.6,1.5 ; 19.2,-1.5 19.2,1.525

## 55091-1209 [mm]
pads (124):
  round 0.9 hole 0.9: 1(-19.985,0)
  rect 0.35x2.5 smd: 1(-18.732,2.35) 2(-18.732,-2.35) 3(-18.098,2.35) 4(-18.098,-2.35) 5(-17.462,2.35) 6(-17.462,-2.35) 7(-16.828,2.35) 8(-16.828,-2.35) 9(-16.192,2.35) 10(-16.192,-2.35) 11(-15.557,2.35) 12(-15.557,-2.35) 13(-14.922,2.35) 14(-14.922,-2.35) 15(-14.287,2.35) 16(-14.287,-2.35) 17(-13.652,2.35) 18(-13.652,-2.35) 19(-13.018,2.35) 20(-13.018,-2.35) 21(-12.383,2.35) 22(-12.383,-2.35) 23(-11.747,2.35) 24(-11.747,-2.35) 25(-11.112,2.35) 26(-11.112,-2.35) 27(-10.477,2.35) 28(-10.477,-2.35) 29(-9.842,2.35) 30(-9.842,-2.35) 31(-9.207,2.35) 32(-9.207,-2.35) 33(-8.572,2.35) 34(-8.572,-2.35) 35(-7.938,2.35) 36(-7.938,-2.35) 37(-7.302,2.35) 38(-7.302,-2.35) 39(-6.667,2.35) 40(-6.667,-2.35) 41(-6.032,2.35) 42(-6.032,-2.35) 43(-5.397,2.35) 44(-5.397,-2.35) 45(-4.763,2.35) 46(-4.763,-2.35) 47(-4.127,2.35) 48(-4.127,-2.35) 49(-3.492,2.35) 50(-3.492,-2.35) 51(-2.857,2.35) 52(-2.857,-2.35) 53(-2.222,2.35) 54(-2.222,-2.35) 55(-1.587,2.35) 56(-1.587,-2.35) 57(-0.953,2.35) 58(-0.953,-2.35) 59(-0.318,2.35) 60(-0.318,-2.35) 61(0.318,2.35) 62(0.318,-2.35) 63(0.953,2.35) 64(0.953,-2.35) 65(1.587,2.35) 66(1.587,-2.35) 67(2.222,2.35) 68(2.222,-2.35) 69(2.857,2.35) 70(2.857,-2.35) 71(3.492,2.35) 72(3.492,-2.35) 73(4.127,2.35) 74(4.127,-2.35) 75(4.763,2.35) 76(4.763,-2.35) 77(5.397,2.35) 78(5.397,-2.35) 79(6.032,2.35) 80(6.032,-2.35) 81(6.667,2.35) 82(6.667,-2.35) 83(7.302,2.35) 84(7.302,-2.35) 85(7.938,2.35) 86(7.938,-2.35) 87(8.572,2.35) 88(8.572,-2.35) 89(9.207,2.35) 90(9.207,-2.35) 91(9.842,2.35) 92(9.842,-2.35) 93(10.477,2.35) 94(10.477,-2.35) 95(11.112,2.35) 96(11.112,-2.35) 97(11.747,2.35) 98(11.747,-2.35) 99(12.383,2.35) 100(12.383,-2.35) 101(13.018,2.35) 102(13.018,-2.35) 103(13.652,2.35) 104(13.652,-2.35) 105(14.287,2.35) 106(14.287,-2.35) 107(14.922,2.35) 108(14.922,-2.35) 109(15.557,2.35) 110(15.557,-2.35) 111(16.192,2.35) 112(16.192,-2.35) 113(16.828,2.35) 114(16.828,-2.35) 115(17.462,2.35) 116(17.462,-2.35) 117(18.098,2.35) 118(18.098,-2.35) 119(18.732,2.35) 120(18.732,-2.35)
  round 0.7 hole 0.7: 1(19.985,0)
  rect 2.5x2 smd: M1(-21.8,0) M2(21.8,0)
Top Overlay:
  lines w0.203: -22.3,-1.5 -22.9,-1.5 -22.9,-3.1 -20.9,-3.1 -20.9,-2.4 ; -22.3,1.5 -22.9,1.5 -22.9,1.875 -21.675,3.1 -20.9,3.1 -20.9,2.4 ; -19.3,-2 -21.05,-2 -21.05,0 -20.3,0 -20.3,2 -19.3,2 ; -19.3,-1 cw(c-19.3,-0.75) -19.55,-0.75 -19.55,0.75 cw(c-19.3,0.75) -19.3,1 ; 19.3,-2 21.05,-2 21.05,0 20.3,0 20.3,2 19.3,2 ; 19.3,-1 ccw(c19.3,-0.75) 19.55,-0.75 19.55,0.75 ccw(c19.3,0.75) 19.3,1 ; 20.9,-2.4 20.9,-3.1 22.9,-3.1 22.9,-1.5 22.3,-1.5 ; 20.9,2.4 20.9,3.1 22.9,3.1 22.9,1.5 22.3,1.5
Top Solder:
  rectangle: -18.932,1.075 -18.533,3.625
  region: -18.533,-1.075 -18.932,-1.075 -18.932,-3.625 -18.533,-3.625
  rectangle: -18.297,1.075 -17.898,3.625
  region: -17.898,-1.075 -18.297,-1.075 -18.297,-3.625 -17.898,-3.625
  rectangle: -17.662,1.075 -17.263,3.625
  region: -17.263,-1.075 -17.662,-1.075 -17.662,-3.625 -17.263,-3.625
  rectangle: -17.027,1.075 -16.628,3.625
  region: -16.628,-1.075 -17.027,-1.075 -17.027,-3.625 -16.628,-3.625
  rectangle: -16.392,1.075 -15.993,3.625
  region: -15.993,-1.075 -16.392,-1.075 -16.392,-3.625 -15.993,-3.625
  rectangle: -15.757,1.075 -15.358,3.625
  region: -15.358,-1.075 -15.757,-1.075 -15.757,-3.625 -15.358,-3.625
  rectangle: -15.122,1.075 -14.723,3.625
  region: -14.723,-1.075 -15.122,-1.075 -15.122,-3.625 -14.723,-3.625
  rectangle: -14.487,1.075 -14.088,3.625
  region: -14.088,-1.075 -14.487,-1.075 -14.487,-3.625 -14.088,-3.625
  rectangle: -13.852,1.075 -13.453,3.625
  region: -13.453,-1.075 -13.852,-1.075 -13.852,-3.625 -13.453,-3.625
  rectangle: -13.217,1.075 -12.818,3.625
  region: -12.818,-1.075 -13.217,-1.075 -13.217,-3.625 -12.818,-3.625
  rectangle: -12.582,1.075 -12.183,3.625
  region: -12.183,-1.075 -12.582,-1.075 -12.582,-3.625 -12.183,-3.625
  rectangle: -11.947,1.075 -11.548,3.625
  region: -11.548,-1.075 -11.947,-1.075 -11.947,-3.625 -11.548,-3.625
  rectangle: -11.312,1.075 -10.913,3.625
  region: -10.913,-1.075 -11.312,-1.075 -11.312,-3.625 -10.913,-3.625
  rectangle: -10.677,1.075 -10.278,3.625
  region: -10.278,-1.075 -10.677,-1.075 -10.677,-3.625 -10.278,-3.625
  rectangle: -10.042,1.075 -9.643,3.625
  region: -9.643,-1.075 -10.042,-1.075 -10.042,-3.625 -9.643,-3.625
  rectangle: -9.407,1.075 -9.008,3.625
  region: -9.008,-1.075 -9.407,-1.075 -9.407,-3.625 -9.008,-3.625
  rectangle: -8.772,1.075 -8.373,3.625
  region: -8.373,-1.075 -8.772,-1.075 -8.772,-3.625 -8.373,-3.625
  rectangle: -8.137,1.075 -7.738,3.625
  region: -7.738,-1.075 -8.137,-1.075 -8.137,-3.625 -7.738,-3.625
  rectangle: -7.502,1.075 -7.103,3.625
  region: -7.103,-1.075 -7.502,-1.075 -7.502,-3.625 -7.103,-3.625
  rectangle: -6.867,1.075 -6.468,3.625
  region: -6.468,-1.075 -6.867,-1.075 -6.867,-3.625 -6.468,-3.625
  rectangle: -6.232,1.075 -5.833,3.625
  region: -5.833,-1.075 -6.232,-1.075 -6.232,-3.625 -5.833,-3.625
  rectangle: -5.597,1.075 -5.198,3.625
  region: -5.198,-1.075 -5.597,-1.075 -5.597,-3.625 -5.198,-3.625
  rectangle: -4.962,1.075 -4.563,3.625
  region: -4.563,-1.075 -4.962,-1.075 -4.962,-3.625 -4.563,-3.625
  rectangle: -4.327,1.075 -3.928,3.625
  region: -3.928,-1.075 -4.327,-1.075 -4.327,-3.625 -3.928,-3.625
  rectangle: -3.692,1.075 -3.293,3.625
  region: -3.293,-1.075 -3.692,-1.075 -3.692,-3.625 -3.293,-3.625
  rectangle: -3.057,1.075 -2.658,3.625
  region: -2.658,-1.075 -3.057,-1.075 -3.057,-3.625 -2.658,-3.625
  rectangle: -2.422,1.075 -2.023,3.625
  region: -2.023,-1.075 -2.422,-1.075 -2.422,-3.625 -2.023,-3.625
  rectangle: -1.787,1.075 -1.388,3.625
  region: -1.388,-1.075 -1.787,-1.075 -1.787,-3.625 -1.388,-3.625
  rectangle: -1.152,1.075 -0.753,3.625
  region: -0.753,-1.075 -1.152,-1.075 -1.152,-3.625 -0.753,-3.625
  rectangle: -0.517,1.075 -0.118,3.625
  region: -0.118,-1.075 -0.517,-1.075 -0.517,-3.625 -0.118,-3.625
  rectangle: 0.118,1.075 0.517,3.625
  region: 0.517,-1.075 0.118,-1.075 0.118,-3.625 0.517,-3.625
  rectangle: 0.753,1.075 1.152,3.625
  region: 1.152,-1.075 0.753,-1.075 0.753,-3.625 1.152,-3.625
  rectangle: 1.388,1.075 1.787,3.625
  region: 1.787,-1.075 1.388,-1.075 1.388,-3.625 1.787,-3.625
  rectangle: 2.023,1.075 2.422,3.625
  region: 2.422,-1.075 2.023,-1.075 2.023,-3.625 2.422,-3.625
  rectangle: 2.658,1.075 3.057,3.625
  region: 3.057,-1.075 2.658,-1.075 2.658,-3.625 3.057,-3.625
  rectangle: 3.293,1.075 3.692,3.625
  region: 3.692,-1.075 3.293,-1.075 3.293,-3.625 3.692,-3.625
  rectangle: 3.928,1.075 4.327,3.625
  region: 4.327,-1.075 3.928,-1.075 3.928,-3.625 4.327,-3.625
  rectangle: 4.563,1.075 4.962,3.625
  region: 4.962,-1.075 4.563,-1.075 4.563,-3.625 4.962,-3.625
  rectangle: 5.198,1.075 5.597,3.625
  region: 5.597,-1.075 5.198,-1.075 5.198,-3.625 5.597,-3.625
  rectangle: 5.833,1.075 6.232,3.625
  region: 6.232,-1.075 5.833,-1.075 5.833,-3.625 6.232,-3.625
  rectangle: 6.468,1.075 6.867,3.625
  region: 6.867,-1.075 6.468,-1.075 6.468,-3.625 6.867,-3.625
  rectangle: 7.103,1.075 7.502,3.625
  region: 7.502,-1.075 7.103,-1.075 7.103,-3.625 7.502,-3.625
  rectangle: 7.738,1.075 8.137,3.625
  region: 8.137,-1.075 7.738,-1.075 7.738,-3.625 8.137,-3.625
  rectangle: 8.373,1.075 8.772,3.625
  region: 8.772,-1.075 8.373,-1.075 8.373,-3.625 8.772,-3.625
  rectangle: 9.008,1.075 9.407,3.625
  region: 9.407,-1.075 9.008,-1.075 9.008,-3.625 9.407,-3.625
  rectangle: 9.643,1.075 10.042,3.625
  region: 10.042,-1.075 9.643,-1.075 9.643,-3.625 10.042,-3.625
  rectangle: 10.278,1.075 10.677,3.625
  region: 10.677,-1.075 10.278,-1.075 10.278,-3.625 10.677,-3.625
  rectangle: 10.913,1.075 11.312,3.625
  region: 11.312,-1.075 10.913,-1.075 10.913,-3.625 11.312,-3.625
  rectangle: 11.548,1.075 11.947,3.625
  region: 11.947,-1.075 11.548,-1.075 11.548,-3.625 11.947,-3.625
  rectangle: 12.183,1.075 12.582,3.625
  region: 12.582,-1.075 12.183,-1.075 12.183,-3.625 12.582,-3.625
  rectangle: 12.818,1.075 13.217,3.625
  region: 13.217,-1.075 12.818,-1.075 12.818,-3.625 13.217,-3.625
  rectangle: 13.453,1.075 13.852,3.625
  region: 13.852,-1.075 13.453,-1.075 13.453,-3.625 13.852,-3.625
  rectangle: 14.088,1.075 14.487,3.625
  region: 14.487,-1.075 14.088,-1.075 14.088,-3.625 14.487,-3.625
  rectangle: 14.723,1.075 15.122,3.625
  region: 15.122,-1.075 14.723,-1.075 14.723,-3.625 15.122,-3.625
  rectangle: 15.358,1.075 15.757,3.625
  region: 15.757,-1.075 15.358,-1.075 15.358,-3.625 15.757,-3.625
  rectangle: 15.993,1.075 16.392,3.625
  region: 16.392,-1.075 15.993,-1.075 15.993,-3.625 16.392,-3.625
  rectangle: 16.628,1.075 17.027,3.625
  region: 17.027,-1.075 16.628,-1.075 16.628,-3.625 17.027,-3.625
  rectangle: 17.263,1.075 17.662,3.625
  region: 17.662,-1.075 17.263,-1.075 17.263,-3.625 17.662,-3.625
  rectangle: 17.898,1.075 18.297,3.625
  region: 18.297,-1.075 17.898,-1.075 17.898,-3.625 18.297,-3.625
  rectangle: 18.533,1.075 18.932,3.625
  region: 18.932,-1.075 18.533,-1.075 18.533,-3.625 18.932,-3.625
Mechanical 16:
  rectangle: -18.883,-3.1 -18.582,-2.375
  region: -18.582,3.1 -18.883,3.1 -18.883,2.375 -18.582,2.375
  rectangle: -18.248,-3.1 -17.947,-2.375
  region: -17.947,3.1 -18.248,3.1 -18.248,2.375 -17.947,2.375
  rectangle: -17.613,-3.1 -17.312,-2.375
  region: -17.312,3.1 -17.613,3.1 -17.613,2.375 -17.312,2.375
  rectangle: -16.978,-3.1 -16.677,-2.375
  region: -16.677,3.1 -16.978,3.1 -16.978,2.375 -16.677,2.375
  rectangle: -16.343,-3.1 -16.042,-2.375
  region: -16.042,3.1 -16.343,3.1 -16.343,2.375 -16.042,2.375
  rectangle: -15.708,-3.1 -15.407,-2.375
  region: -15.407,3.1 -15.708,3.1 -15.708,2.375 -15.407,2.375
  rectangle: -15.073,-3.1 -14.772,-2.375
  region: -14.772,3.1 -15.073,3.1 -15.073,2.375 -14.772,2.375
  rectangle: -14.438,-3.1 -14.137,-2.375
  region: -14.137,3.1 -14.438,3.1 -14.438,2.375 -14.137,2.375
  rectangle: -13.803,-3.1 -13.502,-2.375
  region: -13.502,3.1 -13.803,3.1 -13.803,2.375 -13.502,2.375
  rectangle: -13.168,-3.1 -12.867,-2.375
  region: -12.867,3.1 -13.168,3.1 -13.168,2.375 -12.867,2.375
  rectangle: -12.533,-3.1 -12.232,-2.375
  region: -12.232,3.1 -12.533,3.1 -12.533,2.375 -12.232,2.375
  rectangle: -11.898,-3.1 -11.597,-2.375
  region: -11.597,3.1 -11.898,3.1 -11.898,2.375 -11.597,2.375
  rectangle: -11.263,-3.1 -10.962,-2.375
  region: -10.962,3.1 -11.263,3.1 -11.263,2.375 -10.962,2.375
  rectangle: -10.628,-3.1 -10.327,-2.375
  region: -10.327,3.1 -10.628,3.1 -10.628,2.375 -10.327,2.375
  rectangle: -9.993,-3.1 -9.692,-2.375
  region: -9.692,3.1 -9.993,3.1 -9.993,2.375 -9.692,2.375
  rectangle: -9.358,-3.1 -9.057,-2.375
  region: -9.057,3.1 -9.358,3.1 -9.358,2.375 -9.057,2.375
  rectangle: -8.723,-3.1 -8.422,-2.375
  region: -8.422,3.1 -8.723,3.1 -8.723,2.375 -8.422,2.375
  rectangle: -8.088,-3.1 -7.787,-2.375
  region: -7.787,3.1 -8.088,3.1 -8.088,2.375 -7.787,2.375
  rectangle: -7.453,-3.1 -7.152,-2.375
  region: -7.152,3.1 -7.453,3.1 -7.453,2.375 -7.152,2.375
  rectangle: -6.818,-3.1 -6.517,-2.375
  region: -6.517,3.1 -6.818,3.1 -6.818,2.375 -6.517,2.375
  rectangle: -6.183,-3.1 -5.882,-2.375
  region: -5.882,3.1 -6.183,3.1 -6.183,2.375 -5.882,2.375
  rectangle: -5.548,-3.1 -5.247,-2.375
  region: -5.247,3.1 -5.548,3.1 -5.548,2.375 -5.247,2.375
  rectangle: -4.913,-3.1 -4.612,-2.375
  region: -4.612,3.1 -4.913,3.1 -4.913,2.375 -4.612,2.375
  rectangle: -4.278,-3.1 -3.977,-2.375
  region: -3.977,3.1 -4.278,3.1 -4.278,2.375 -3.977,2.375
  rectangle: -3.643,-3.1 -3.342,-2.375
  region: -3.342,3.1 -3.643,3.1 -3.643,2.375 -3.342,2.375
  rectangle: -3.008,-3.1 -2.707,-2.375
  region: -2.707,3.1 -3.008,3.1 -3.008,2.375 -2.707,2.375
  rectangle: -2.373,-3.1 -2.072,-2.375
  region: -2.072,3.1 -2.373,3.1 -2.373,2.375 -2.072,2.375
  rectangle: -1.738,-3.1 -1.437,-2.375
  region: -1.437,3.1 -1.738,3.1 -1.738,2.375 -1.437,2.375
  rectangle: -1.103,-3.1 -0.802,-2.375
  region: -0.802,3.1 -1.103,3.1 -1.103,2.375 -0.802,2.375
  rectangle: -0.468,-3.1 -0.167,-2.375
  region: -0.167,3.1 -0.468,3.1 -0.468,2.375 -0.167,2.375
  rectangle: 0.167,-3.1 0.468,-2.375
  region: 0.468,3.1 0.167,3.1 0.167,2.375 0.468,2.375
  rectangle: 0.802,-3.1 1.103,-2.375
  region: 1.103,3.1 0.802,3.1 0.802,2.375 1.103,2.375
  rectangle: 1.437,-3.1 1.738,-2.375
  region: 1.738,3.1 1.437,3.1 1.437,2.375 1.738,2.375
  rectangle: 2.072,-3.1 2.373,-2.375
  region: 2.373,3.1 2.072,3.1 2.072,2.375 2.373,2.375
  rectangle: 2.707,-3.1 3.008,-2.375
  region: 3.008,3.1 2.707,3.1 2.707,2.375 3.008,2.375
  rectangle: 3.342,-3.1 3.643,-2.375
  region: 3.643,3.1 3.342,3.1 3.342,2.375 3.643,2.375
  rectangle: 3.977,-3.1 4.278,-2.375
  region: 4.278,3.1 3.977,3.1 3.977,2.375 4.278,2.375
  rectangle: 4.612,-3.1 4.913,-2.375
  region: 4.913,3.1 4.612,3.1 4.612,2.375 4.913,2.375
  rectangle: 5.247,-3.1 5.548,-2.375
  region: 5.548,3.1 5.247,3.1 5.247,2.375 5.548,2.375
  rectangle: 5.882,-3.1 6.183,-2.375
  region: 6.183,3.1 5.882,3.1 5.882,2.375 6.183,2.375
  rectangle: 6.517,-3.1 6.818,-2.375
  region: 6.818,3.1 6.517,3.1 6.517,2.375 6.818,2.375
  rectangle: 7.152,-3.1 7.453,-2.375
  region: 7.453,3.1 7.152,3.1 7.152,2.375 7.453,2.375
  rectangle: 7.787,-3.1 8.088,-2.375
  region: 8.088,3.1 7.787,3.1 7.787,2.375 8.088,2.375
  rectangle: 8.422,-3.1 8.723,-2.375
  region: 8.723,3.1 8.422,3.1 8.422,2.375 8.723,2.375
  rectangle: 9.057,-3.1 9.358,-2.375
  region: 9.358,3.1 9.057,3.1 9.057,2.375 9.358,2.375
  rectangle: 9.692,-3.1 9.993,-2.375
  region: 9.993,3.1 9.692,3.1 9.692,2.375 9.993,2.375
  rectangle: 10.327,-3.1 10.628,-2.375
  region: 10.628,3.1 10.327,3.1 10.327,2.375 10.628,2.375
  rectangle: 10.962,-3.1 11.263,-2.375
  region: 11.263,3.1 10.962,3.1 10.962,2.375 11.263,2.375
  rectangle: 11.597,-3.1 11.898,-2.375
  region: 11.898,3.1 11.597,3.1 11.597,2.375 11.898,2.375
  rectangle: 12.232,-3.1 12.533,-2.375
  region: 12.533,3.1 12.232,3.1 12.232,2.375 12.533,2.375
  rectangle: 12.867,-3.1 13.168,-2.375
  region: 13.168,3.1 12.867,3.1 12.867,2.375 13.168,2.375
  rectangle: 13.502,-3.1 13.803,-2.375
  region: 13.803,3.1 13.502,3.1 13.502,2.375 13.803,2.375
  rectangle: 14.137,-3.1 14.438,-2.375
  region: 14.438,3.1 14.137,3.1 14.137,2.375 14.438,2.375
  rectangle: 14.772,-3.1 15.073,-2.375
  region: 15.073,3.1 14.772,3.1 14.772,2.375 15.073,2.375
  rectangle: 15.407,-3.1 15.708,-2.375
  region: 15.708,3.1 15.407,3.1 15.407,2.375 15.708,2.375
  rectangle: 16.042,-3.1 16.343,-2.375
  region: 16.343,3.1 16.042,3.1 16.042,2.375 16.343,2.375
  rectangle: 16.677,-3.1 16.978,-2.375
  region: 16.978,3.1 16.677,3.1 16.677,2.375 16.978,2.375
  rectangle: 17.312,-3.1 17.613,-2.375
  region: 17.613,3.1 17.312,3.1 17.312,2.375 17.613,2.375
  rectangle: 17.947,-3.1 18.248,-2.375
  region: 18.248,3.1 17.947,3.1 17.947,2.375 18.248,2.375
  rectangle: 18.582,-3.1 18.883,-2.375
  region: 18.883,3.1 18.582,3.1 18.582,2.375 18.883,2.375
  lines w0.203: -22.3,-1.5 -22.3,1.5 ; -20.9,-2.4 20.9,-2.4 ; -20.9,2.4 20.9,2.4 ; -19.3,-2 19.3,-2 ; -19.3,-1 19.3,-1 ; -19.3,1 19.3,1 ; -19.3,2 19.3,2 ; 22.3,-1.5 22.3,1.5